# Altium footprint library TranDangKhoa-LIB.PcbLib: 1435 footprints (part 15 of 90)
Each footprint in its own frame and in the unit in brackets; x right, y up, seen from the top. Pads: shape width x height; smd on the part's side, far side on the other; paste and mask are expansions set on the pad; w line width, h text height; cw(c..) or ccw(c..) is an arc to the next point about the centre after c.
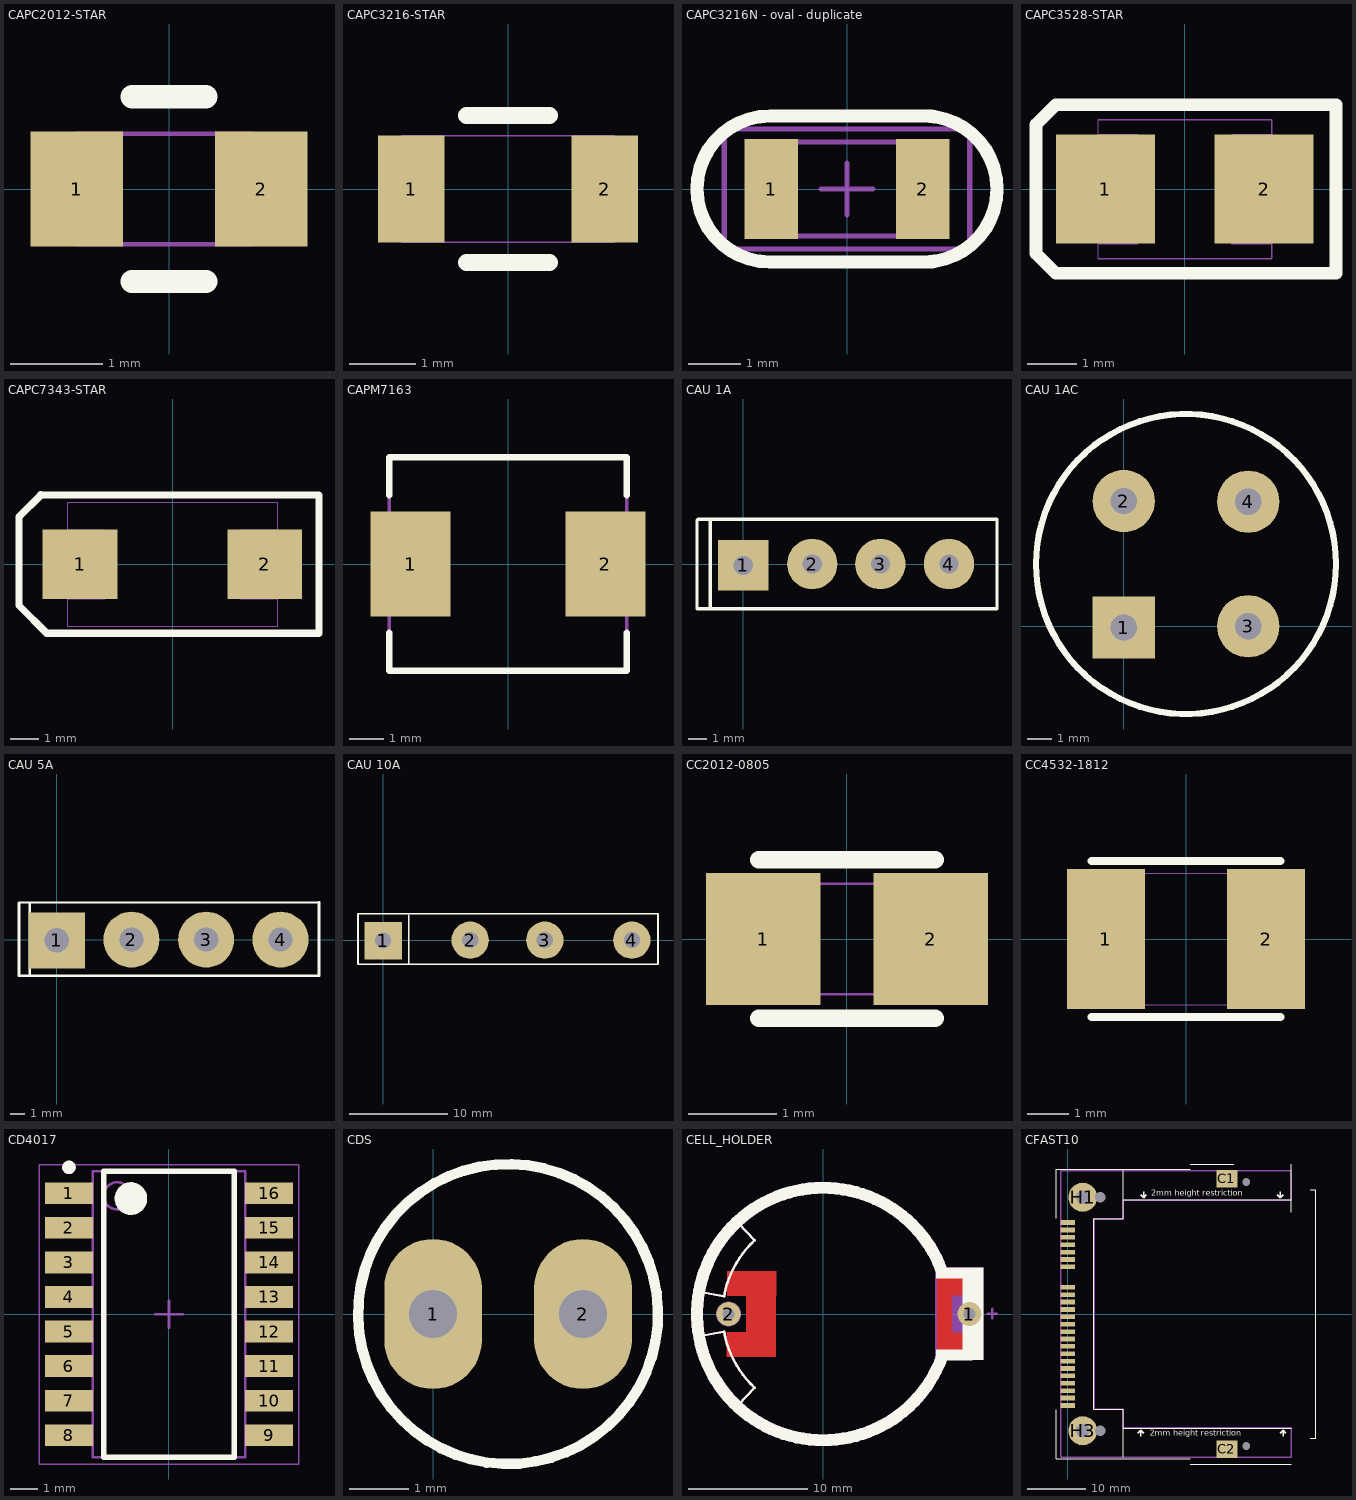
[diagram p14: the footprints below, top view; thin cyan lines are the x and y axes]

## CAPC2012-STAR [mm]
pads (2):
  rect 1x1.25 smd: 1(-1,0) 2(1,0)
Top Overlay:
  lines w0.25: -0.4,-1 0.4,-1
  lines w0.254: -0.4,1 0.4,1
Mechanical 7:
  lines w0.05: -1,-0.6 -1,0.6 0.9,0.6 0.9,-0.6 -1,-0.6
  text ".Designator" at -0.9,0.15 h0.4
  text ".Comment" at -0.9,-0.475 h0.4
3D body: height 0.8, standoff 0, extent -0.528,-0.615 0.435,0.6
3D body: height 0.8, standoff 0, extent 0.435,-0.642 0.867,0.6
3D body: height 0.8, standoff 0, extent -0.978,-0.615 -0.528,0.6

## CAPC3216-STAR [mm]
pads (2):
  rect 1x1.6 smd: 1(-1.45,0) 2(1.45,0)
Top Overlay:
  lines w0.254: -0.625,-1.1 0.625,-1.1 ; -0.625,1.1 0.625,1.1
Mechanical 7:
  lines w0.025: -1.6,-0.8 -1.6,0.8 1.6,0.8 1.6,-0.8 -1.6,-0.8
  text ".Designator" at -1.5,0.4 h0.4
  text ".Comment" at -1.5,-0.7 h0.4
3D body: height 0.9, standoff 0, extent -0.618,-0.849 0.675,0.858
3D body: height 0.9, standoff 0, extent 0.67,-0.867 1.632,0.858
3D body: height 0.9, standoff 0, extent -1.636,-0.893 -0.618,0.84

## CAPC3216N - oval - duplicate [mm]
pads (2):
  rect 1.016x1.905 smd: 1(-1.45,0) 2(1.45,0)
Top Overlay:
  lines w0.254: -1.477,-1.397 1.637,-1.397 ; -1.473,-1.397 cw(c-1.473,0) -1.473,1.397 ; -1.427,1.397 1.621,1.397 ; 1.473,-1.397 ccw(c1.473,0) 1.473,1.397
Mechanical 13:
  lines w0.1: -1.7,-0.9 1.7,-0.9 1.7,0.9 -1.7,0.9 -1.7,-0.9
Mechanical 15:
  lines w0.1: -0.5,0 0.5,0 ; 0,-0.5 0,0.5 ; -2.35,-1.15 2.35,-1.15 2.35,1.15 -2.35,1.15 -2.35,-1.15
3D body "1206 SMD Capacitor.step": height 1, standoff 0, extent -1.64,-0.8 1.56,0.8

## CAPC3528-STAR [mm]
pads (2):
  rect 2x2.2 smd: 1(-1.6,0) 2(1.6,0)
Top Overlay:
  lines w0.254: -3,-1.3 -2.6,-1.7 3.05,-1.7 3.05,1.7 -2.6,1.7 -3,1.3 -3,-1.3
Mechanical 7:
  lines w0.025: -1.748,-1.404 1.752,-1.404 1.752,1.396 -1.748,1.396 ; -1.748,-1.104 -0.948,-1.104 -0.948,1.096 -1.748,1.096 ; -1.748,-1.404 -1.748,1.396 ; 1.752,-1.104 0.952,-1.104 0.952,1.096 1.752,1.096
  text ".Designator" at -1.8,1.8 h0.5
  text ".Comment" at -1.7,-2.2 h0.5
3D body: height 0.3, standoff 0, extent -1.793,-0.665 -1.568,0.824
3D body: height 0.3, standoff 0, extent 1.578,-0.658 1.803,0.768
3D body: height 1, standoff 0, extent -1.704,-1.539 1.763,1.537

## CAPC7343-STAR [mm]
pads (2):
  rect 2.6x2.4 smd: 1(-3.202,0.007) 2(3.198,0.007)
Top Overlay:
  lines w0.254: -4.575,2.4 -5.325,1.65 -5.325,-1.425 -4.362,-2.388 ; -4.572,2.413 5.08,2.406 ; -4.369,-2.388 5.08,-2.388 5.08,2.388
Mechanical 7:
  lines w0.025: -3.651,-1.192 -2.351,-1.192 -2.351,1.208 -3.651,1.208 ; 3.649,-1.192 2.349,-1.192 2.349,1.208 3.649,1.208 ; -3.651,-2.142 3.649,-2.142 3.649,2.158 -3.651,2.158 -3.651,-2.142
  text ".Designator" at -3.575,1.375 h0.6
  text ".Comment" at -3.575,-2.025 h0.6
3D body: height 4.05, standoff 3.9, extent -2.468,-2.017 -1.993,2.005
3D body: height 0.3, standoff 0, extent 3.308,-0.855 3.512,0.915
3D body: height 0.3, standoff 0, extent -3.487,-0.869 -3.392,0.82
3D body: height 4, standoff 0, extent -3.464,-2.032 3.481,2.039

## CAPM7163 [mm]
pads (2):
  rect 2.35x3.1 smd: 1(-2.875,0) 2(2.875,0)
Top Overlay:
  lines w0.2: -3.5,-2.025 -3.5,-3.15 0,-3.15 3.5,-3.15 3.5,-2.025 ; -3.5,2.025 -3.5,3.15 0,3.15 3.5,3.15 3.5,2.025
Mechanical 7:
  lines w0.1: -3.5,-3.15 -3.5,3.15 0,3.15 3.5,3.15 3.5,-3.15 0,-3.15 -3.5,-3.15
  text ".Designator" at -3.065,2.159 h0.8
  text ".Comment" at -3.048,-2.794 h0.8
3D body: height 0.5, standoff 0, extent 2.68,-0.709 3.201,0.819
3D body: height 0.5, standoff 0, extent -3.1,-0.742 -2.579,0.785
3D body: height 1.5, standoff 0, extent -3.018,-2.635 3.086,2.806

## CAU 1A [mil] "CAU 1A DET"
height 800
pads (4):
  rect 110x110 hole 42: 1(0,-2)
  round 110 hole 42: 2(151,1) 3(300,1) 4(450,1)
Top Overlay:
  lines w7: -72,-95 -72,99 ; -101,-97 555,-97 555,99 -99,99 -101,97 -101,-97
3D body "SW3dPS-KBPM.STEP": height 453.36, standoff -499.4, extent -61.99,-90 511.99,107.24

## CAU 1AC [mil] "CAU 1A TRON"
height 800
pads (4):
  rect 100x100 hole 42: 1(0,-2)
  round 100 hole 42: 2(0,201) 3(200,0) 4(200,200)
Top Overlay:
  circle w10: c100,100 r240.88

## CAU 5A [mil] "CAU 5A DET"
height 800
pads (4):
  rect 150x150 hole 65: 1(0,-2)
  round 150 hole 65: 2(200,0) 3(400,0) 4(599,0)
Top Overlay:
  lines w7: -72,-95 -72,99 ; -101,-97 -101,97 -99,99 702,100 702,-97 -101,-97
3D body "User Library-bridge 2.step": height 820.68, standoff -621.62, extent -138.98,-105 738.98,43.03

## CAU 10A [mil] "CAU 10A det"
height 800
pads (4):
  rect 150x150 hole 65: 1(0,-2)
  round 150 hole 65: 2(350,0) 3(650,0) 4(1000,0)
Top Overlay:
  lines w7: 103,-95 103,99 ; -101,-97 1105,-97 1105,106.36 -101,104.86 -101,-97

## CC2012-0805 [mm]
pads (2):
  rect 1.3x1.5 smd: 1(-0.95,0) 2(0.95,0)
Top Overlay:
  lines w0.2: -1,-0.9 1,-0.9 ; -1,0.9 1,0.9
Mechanical 15:
  lines w0.025: -0.975,-0.625 0.975,-0.625 0.975,0.625 -0.975,0.625 -0.975,-0.625

## CC4532-1812 [mm]
pads (2):
  rect 1.9x3.4 smd: 1(-1.95,0) 2(1.95,0)
Top Overlay:
  lines w0.2: -2.3,-1.9 2.3,-1.9 ; -2.3,1.9 2.3,1.9
Mechanical 15:
  lines w0.025: -2.25,-1.6 -2.25,1.6 2.25,1.6 2.25,-1.6 -2.25,-1.6

## CD4017 [mm] "SOP, 16-Leads, Body 10.50x5.60mm, Pitch 1.27mm, IPC Medium Density"
height 2
pads (16):
  rect 1.75x0.8 smd: 1(-3.675,4.445) 2(-3.675,3.175) 3(-3.675,1.905) 4(-3.675,0.635) 5(-3.675,-0.635) 6(-3.675,-1.905) 7(-3.675,-3.175) 8(-3.675,-4.445) 9(3.675,-4.445) 10(3.675,-3.175) 11(3.675,-1.905) 12(3.675,-0.635) 13(3.675,0.635) 14(3.675,1.905) 15(3.675,3.175) 16(3.675,4.445)
Top Overlay:
  circle w0.25: c-3.675,5.395 r0.125
  circle w0.6: c-1.4,4.25 r0.3
  lines w0.2: -2.4,-5.25 -2.4,5.25 2.4,5.25 2.4,-5.25 -2.4,-5.25
Mechanical 13:
  circle w0.1: c-1.9,4.35 r0.5
  lines w0.1: -2.8,-5.25 -2.8,5.25 2.8,5.25 2.8,-5.25 -2.8,-5.25
Mechanical 15:
  lines w0.05: -4.775,-5.5 -4.775,5.5 4.775,5.5 4.775,-5.5 -4.775,-5.5
  lines w0.1: -0.5,0 0.5,0 ; 0,-0.5 0,0.5
3D body "User Library-SOP16_208mil (5_3mm).STEP": height 2.01, standoff -0.4, extent -3.961,-5.1 4.054,5.1

## CDS [mil] "QUANG TRO"
height 300
pads (2):
  oval 65x100 hole 32: 1(0,0) 2(100,0)
Top Overlay:
  lines w7: 136.62,-49.97 cw(c50,0) 137.42,-48.56

## CELL_HOLDER [mm]
pads (2):
  round 2 hole 1: 1(12.275,0) 2(-7.95,0)
Top Layer:
  rectangle: -6.475,-3.6 -3.95,3.6
  region: -3.941,1.527 -3.941,3.602 -8.09,3.602 -8.09,1.527
  region: -8.109,-1.527 -8.109,-3.602 -3.959,-3.602 -3.959,-1.527
  region: 12.298,1.534 12.298,3.609 9.573,3.609 9.573,1.534
  region: 9.577,-1.534 9.577,-3.609 12.302,-3.609 12.302,-1.534
  region: 10.802,3.591 9.577,3.591 9.577,-3.609 10.802,-3.609
Top Overlay:
  rectangle: 11.716,-3.877 13.466,3.898
  region: 9.466,3.873 9.466,2.998 12.591,2.998 12.591,3.873
  region: 12.59,-3.877 12.59,-3.002 9.466,-3.002 9.466,-3.877
  lines w0.2: -10.325,-1.85 -8.35,-1.5 ; -10.325,1.85 -8.35,1.5 ; -8.325,-1.496 ccw(c0,0) -5.759,-6.195 -7.1,-7.625 ; -8.325,1.496 cw(c0,0) -5.759,6.195 -7.1,7.625 ; 10.4,-3.8 12.5,-3.8 ; 10.425,3.8 12.5,3.8
  lines w1: 9.948,3.661 ccw(c0,0) 9.959,-3.63
Mechanical 7:
  circle w0.4: c-7.95,0 r0.848
  rectangle: 9.398,-3.875 13.475,3.9
  lines w0.2: -10.325,-1.85 -8.35,-1.5 ; -10.325,1.85 -8.35,1.5 ; -8.325,-1.496 ccw(c0,0) -5.759,-6.195 -7.1,-7.625 ; -8.325,1.496 cw(c0,0) -5.759,6.195 -7.1,7.625 ; 13.796,0.026 14.396,0.026 14.596,0.026 ; 14.196,-0.374 14.196,0.426
  lines w1: 9.948,3.661 ccw(c0,0) 9.959,-3.63
3D body: height 0.8, standoff 0.1, extent -8.429,-1.202 -0.041,0.999
3D body: height 0.2, standoff -2.3, extent -8.357,-0.418 -7.518,0.395
3D body: height 0.2, standoff -2.3, extent 11.887,-0.381 12.624,0.381
3D body: height 0.18, standoff 0, extent 10.984,-0.459 12.876,0.49
3D body: height 0.5, standoff 0, extent -10.565,-0.628 10.654,10.59
3D body: height 9, standoff 1, extent 9.725,-3.062 11.187,3.239
3D body: height 10, standoff 0, extent 12.652,-3.687 13.171,3.441
3D body: height 9.9, standoff 0, extent 9.646,-3.974 13.165,3.915
3D body: height 6, standoff 0, extent -10.617,-10.589 10.582,10.629
3D body: height 0.5, standoff 0, extent -10.561,-10.522 10.658,0.696

## CFAST10 [mm]
pads (32):
  rect 3.6x3 smd: C1(27.35,23.3) C2(27.35,-23.3)
  round 5 hole 2.3 mask+0.025: H1(2.55,20.08) H3(2.55,-20.08)
  round 0 hole 1.75 unplated: H2(5.55,20.08) H4(5.55,-20.08)
  round 0 hole 1.35 unplated: H5(30.65,22.7) H6(30.65,-22.7)
  rect 2.5x0.8 smd: PC1(0,4.595) PC2(0,3.325) PC3(0,2.055) PC4(0,0.785) PC5(0,-0.485) PC6(0,-1.755) PC7(0,-3.025) PC8(0,-4.295) PC9(0,-5.565) PC10(0,-6.835) PC11(0,-8.105) PC12(0,-9.375) PC13(0,-10.645) PC14(0,-11.915) PC15(0,-13.185) PC16(0,-14.455) PC17(0,-15.725) S1(0,15.725) S2(0,14.455) S3(0,13.185) S4(0,11.915) S5(0,10.645) S6(0,9.375) S7(0,8.105)
Top Overlay:
  lines w0.2: -2,-16.5 -2,-24.9 21,-24.9 ; -2,16.5 -2,24.9 21,24.9 ; 9.47,-24.6 9.47,-16.4 4.47,-16.4 4.47,16.4 9.47,16.4 9.47,24.6 ; 9.47,-19.615 38.4,-19.615 ; 9.47,19.615 38.4,19.615 ; 21,-25.8 38.4,-25.8 ; 21,25.8 28.5,25.8 ; 38.4,17.5 38.4,25.8 ; 41.7,-21.4 42.6,-21.4 42.6,21.4 41.7,21.4
  lines w0.254: 12,-20.5 12.5,-20 ; 12.5,-21 12.5,-20 ; 12.5,20.5 13,20 ; 13,-20.5 12.5,-20 ; 13,21 13,20 ; 13.5,20.5 13,20 ; 36,20.5 36.5,20 ; 36.5,-20.5 37,-20 ; 36.5,21 36.5,20 ; 37,-21 37,-20 ; 37,20.5 36.5,20 ; 37.5,-20.5 37,-20 ; 36.5,20 36.5,20
  text "2mm height restriction" at 14.3,20.3 h1
  text "2mm height restriction" at 14.1,-20.9 h1
Mechanical 16:
  lines w0.254: -1.2,-24.5 -1.2,24.6 38.4,24.6 38.4,19.6 9.5,19.6 9.5,16.5 9.4,16.4 4.5,16.4 4.5,-16.4 9.5,-16.4 9.5,-19.6 38.4,-19.6 38.4,-24.6 -1.1,-24.6 -1.2,-24.5
Mechanical 29:
  text ".Designator" at 0.9,1 h1.52
3D body "N7G24-AOB2-XX-10-OHT_STP.stp": height 7.69, standoff -0.91, extent -1.03,-24.25 38.2,24.25